# Altium footprint library ZLS_Lib.PcbLib: 157 footprints (part 5 of 10)
Each footprint in its own frame and in the unit in brackets; x right, y up, seen from the top. Pads: shape width x height; smd on the part's side, far side on the other; paste and mask are expansions set on the pad; w line width, h text height; cw(c..) or ccw(c..) is an arc to the next point about the centre after c.
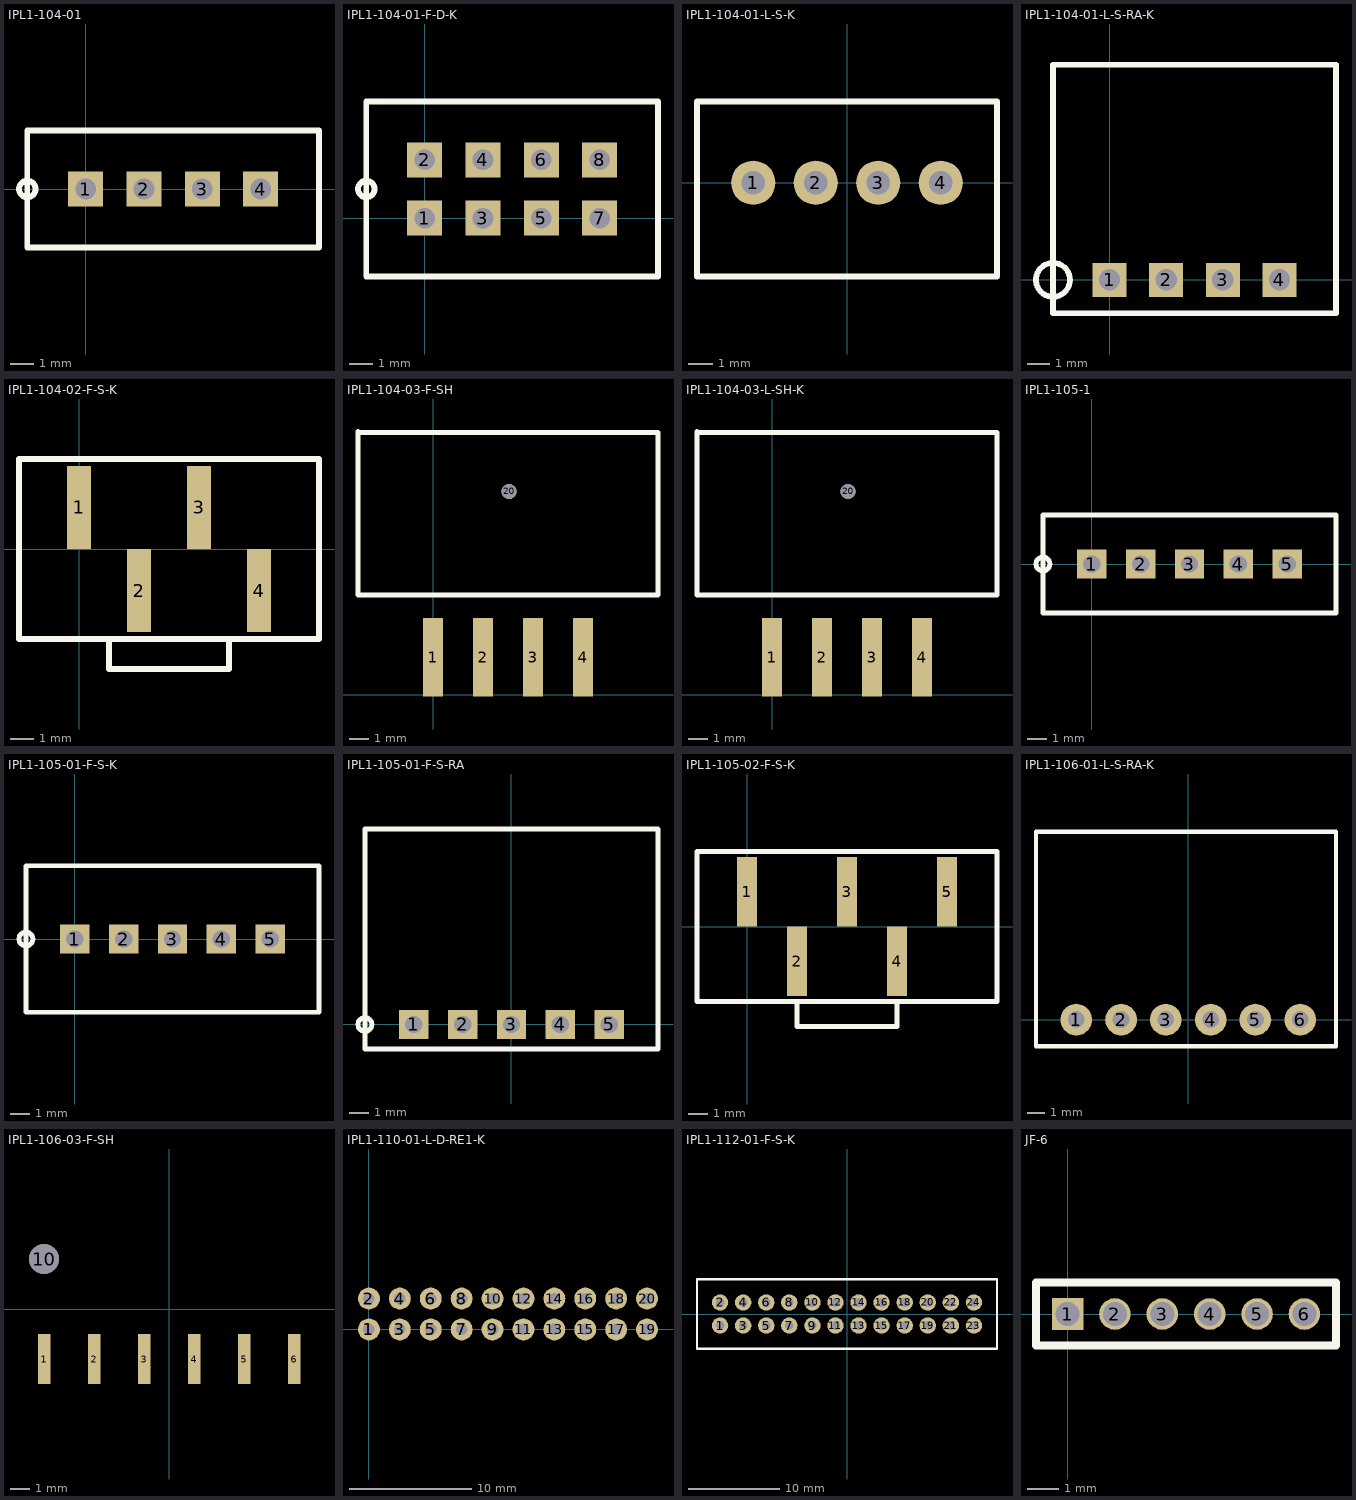
[diagram p4: the footprints below, top view; thin cyan lines are the x and y axes]

## IPL1-104-01 [mil]
height 21496.06
pads (4):
  rect 60x60 hole 35.43: 1(0,0) 2(100,0) 3(200,0) 4(300,0)
Top Overlay:
  circle w10: c-100,0 r14.14
  lines w10: -100,-100 -100,100 400,100 400,-100 -100,-100
3D body "_IPL1_104_01_S_header_2.sldprt": height 320, standoff 0, extent -85.32,-154.62 374.68,105.38

## IPL1-104-01-F-D-K [mil]
height 161
pads (8):
  rect 60x60 hole 35.43: 1(0,0) 2(0,100) 3(100,0) 4(100,100) 5(200,0) 6(200,100) 7(300,0) 8(300,100)
Top Overlay:
  circle w10: c-100,50 r14.14
  lines w10: -100,-100 400,-100 400,200 -100,200 -100,-100
3D body "_IPL1_104_01_D_header_2.sldprt": height 320, standoff 0, extent -80,-121 380,189

## IPL1-104-01-L-S-K [mm]
height 10
pads (4):
  round 1.8 hole 0.95: 1(-3.81,0) 2(-1.27,0) 3(1.27,0) 4(3.81,0)
Top Overlay:
  lines w0.254: -6.096,-3.81 6.096,-3.81 6.096,3.302 -6.096,3.302 -6.096,-3.81
3D body "_IPL1_104_01_S_K_header_2.sldprt": height 8.13, standoff 0, extent -5.842,-3.302 5.842,3.302
3D body "_T_1S64_01_04_S_4.sldprt": height 7.75, standoff -3.05, extent -4.127,-0.571 4.128,0.063

## IPL1-104-01-L-S-RA-K [mil]
pads (4):
  rect 60x60 hole 37.4: 1(0,0) 2(100,0) 3(200,0) 4(300,0)
Top Overlay:
  circle w10: c-100,0 r30
  lines w10: -100,-59.06 400,-59.06 400,380 -100,380 -100,-59.06
3D body "_T_1S64_01_04_S_RA_4.sldprt": height 130.61, standoff -86.89, extent -12.49,-12.49 312.51,365
3D body "_IPL1_104_01_S_RA_K_header_2.sldprt": height 258.11, standoff -1.89, extent -80,60 380,380

## IPL1-104-02-F-S-K [mm]
height 10
pads (4):
  rect 1x3.52 smd: 1(0,1.76) 2(2.54,-1.76) 3(5.08,1.76) 4(7.62,-1.76)
Top Overlay:
  lines w0.254: 1.27,-3.81 1.27,-5.08 6.35,-5.08 6.35,-3.81 ; -2.54,-3.81 -2.54,3.81 10.16,3.81 10.16,-3.81 -2.54,-3.81

## IPL1-104-03-F-SH [mm]
pads (5):
  rect 1x4 smd: 1(0,1.905) 2(2.54,1.905) 3(5.08,1.905) 4(7.62,1.905)
  round 0.762 hole 0.762: 20(3.861,10.33)
Top Overlay:
  lines w0.254: -3.81,13.335 11.43,13.335 11.43,5.08 -3.81,5.08 -3.81,13.385
3D body "_IPL1_104_03_SH_header_2.sldprt": height 6.16, standoff -2.63, extent -2.769,5.461 11.455,13.081
3D body "_T_1S64_03_04_SH_4.sldprt": height 2.66, standoff -0.45, extent -0.317,0.914 7.938,13.716

## IPL1-104-03-L-SH-K [mm]
pads (5):
  rect 1x4 smd: 1(0,1.905) 2(2.54,1.905) 3(5.08,1.905) 4(7.62,1.905)
  round 0.762 hole 0.762: 20(3.861,10.33)
Top Overlay:
  lines w0.254: -3.81,13.335 11.43,13.335 11.43,5.08 -3.81,5.08 -3.81,13.385
3D body "_T_1S64_03_04_SH_4.sldprt": height 2.66, standoff -0.45, extent -0.317,0.914 7.938,13.716
3D body "_IPL1_104_03_SH_header_2.sldprt": height 6.16, standoff -2.63, extent -2.769,5.461 11.455,13.081

## IPL1-105-1 [mil]
height 344.88
pads (5):
  rect 60x60 hole 35.43: 1(0,0) 2(100,0) 3(200,0) 4(300,0) 5(400,0)
Top Overlay:
  circle w10: c-100,0 r14.14
  lines w10: -100,-100 -100,100 500,100 500,-100 -100,-100
3D body "_IPL1_105_01_S_header_2.sldprt": height 320, standoff 0, extent -81.18,-141.73 478.82,118.27

## IPL1-105-01-F-S-K [mil]
pads (5):
  rect 60x60 hole 35.43: 1(0,0) 2(100,0) 3(200,0) 4(300,0) 5(400,0)
Top Overlay:
  circle w10: c-100,0 r14.14
  lines w10: -100,-150 500,-150 500,150 -100,150 -100,-150
3D body "_IPL1_105_01_S_K_header_2.sldprt": height 320, standoff 0, extent -79.99,-139.99 480.01,120.01
3D body "_T_1S64_01_05_S_4.sldprt": height 186.89, standoff -238.11, extent -12.5,-10 412.5,15

## IPL1-105-01-F-S-RA [mil]
pads (5):
  rect 60x60 hole 35.43: 1(-200,0) 2(-100,0) 3(0,0) 4(100,0) 5(200,0)
Top Overlay:
  circle w10: c-300,0 r14.14
  lines w10: -300,-50 -300,400 300,400 300,-50 -300,-50
3D body "_T_1S64_01_05_S_RA_4.sldprt": height 86.89, standoff -130.61, extent -212.5,-7.5 212.5,370
3D body "_IPL1_105_01_S_RA_header_2.sldprt": height 258.11, standoff -1.89, extent -270,70 290,390

## IPL1-105-02-F-S-K [mm]
height 10
pads (5):
  rect 1x3.52 smd: 1(0,1.76) 2(2.54,-1.76) 3(5.08,1.76) 4(7.62,-1.76) 5(10.16,1.76)
Top Overlay:
  lines w0.254: 2.54,-3.81 2.54,-5.08 7.62,-5.08 7.62,-3.81 ; -2.54,-3.81 12.7,-3.81 12.7,3.81 -2.54,3.81 -2.54,-3.81

## IPL1-106-01-L-S-RA-K [mm]
height 8.255
pads (6):
  round 1.8 hole 0.95: 1(-6.35,0) 2(-3.81,0) 3(-1.27,0) 4(1.27,0) 5(3.81,0) 6(6.35,0)
Top Overlay:
  lines w0.254: -8.636,-1.524 8.382,-1.524 8.382,10.668 -8.636,10.668 -8.636,-1.524
3D body "_IPL1_106_01_S_RA_header_2.sldprt": height 6.56, standoff -0.05, extent -8.382,2.286 8.382,10.414
3D body "_T_1S64_01_06_S_RA_4.sldprt": height 3.06, standoff -2.21, extent -6.667,-0.254 6.667,9.334

## IPL1-106-03-F-SH [mil]
pads (7):
  rect 25x100 smd: 1(-250,-100) 2(-150,-100) 3(-50,-100) 4(50,-100) 5(150,-100) 6(250,-100)
  round 60 hole 60: 10(-250,100)
3D body "_T_1S64_03_06_SH_4.sldprt": height 102.5, standoff -20, extent -260,-150 265,354
3D body "_IPL1_106_03_SH_header_2.sldprt": height 240, standoff -106, extent -380,50 380,350

## IPL1-110-01-L-D-RE1-K [mm]
height 10
pads (20):
  round 1.8 hole 0.95: 1(0,0) 2(0,2.54) 3(2.54,0) 4(2.54,2.54) 5(5.08,0) 6(5.08,2.54) 7(7.62,0) 8(7.62,2.54) 9(10.16,0) 10(10.16,2.54) 11(12.7,0) 12(12.7,2.54) 13(15.24,0) 14(15.24,2.54) 15(17.78,0) 16(17.78,2.54) 17(20.32,0) 18(20.32,2.54) 19(22.86,0) 20(22.86,2.54)
3D body "_T_1S64_01_10_D_RE1_4.sldprt": height 6.59, standoff -2.49, extent -0.317,-0.254 23.177,11.874
3D body "_IPL1_110_01_D_RE1_K_header_2.sldprt": height 9.14, standoff -0.13, extent -3.302,4.318 26.162,11.938

## IPL1-112-01-F-S-K [mm]
height 10
pads (24):
  round 1.8 hole 0.95: 1(-13.97,-1.27) 2(-13.97,1.27) 3(-11.43,-1.27) 4(-11.43,1.27) 5(-8.89,-1.27) 6(-8.89,1.27) 7(-6.35,-1.27) 8(-6.35,1.27) 9(-3.81,-1.27) 10(-3.81,1.27) 11(-1.27,-1.27) 12(-1.27,1.27) 13(1.27,-1.27) 14(1.27,1.27) 15(3.81,-1.27) 16(3.81,1.27) 17(6.35,-1.27) 18(6.35,1.27) 19(8.89,-1.27) 20(8.89,1.27) 21(11.43,-1.27) 22(11.43,1.27) 23(13.97,-1.27) 24(13.97,1.27)
Top Overlay:
  lines w0.254: -16.51,-3.81 -16.51,3.81 16.51,3.81 16.51,-3.81 -16.51,-3.81
3D body "_IPL1_112_01_D_K_header_2.sldprt": height 8.13, standoff 0, extent -15.951,-4.318 16.053,3.556
3D body "_T_1S64_01_12_D_4.sldprt": height 7.75, standoff -3.05, extent -14.262,-1.676 14.313,1.499

## JF-6 [mm] "Microtech Connector"
pads (6):
  rect 1x1 hole 0.762: 1(0,0)
  round 1 hole 0.762: 2(1.5,0) 3(3,0) 4(4.5,0) 5(6,0) 6(7.5,0)
Top Overlay:
  lines w0.254: -1,-1 -1,1 8.5,1 8.5,-1 -1,-1